# Altium integrated library Axiom_Gamma_LSB.IntLib: 24 symbols
Pins are listed as number, name and electrical type; pins without a type are passive.

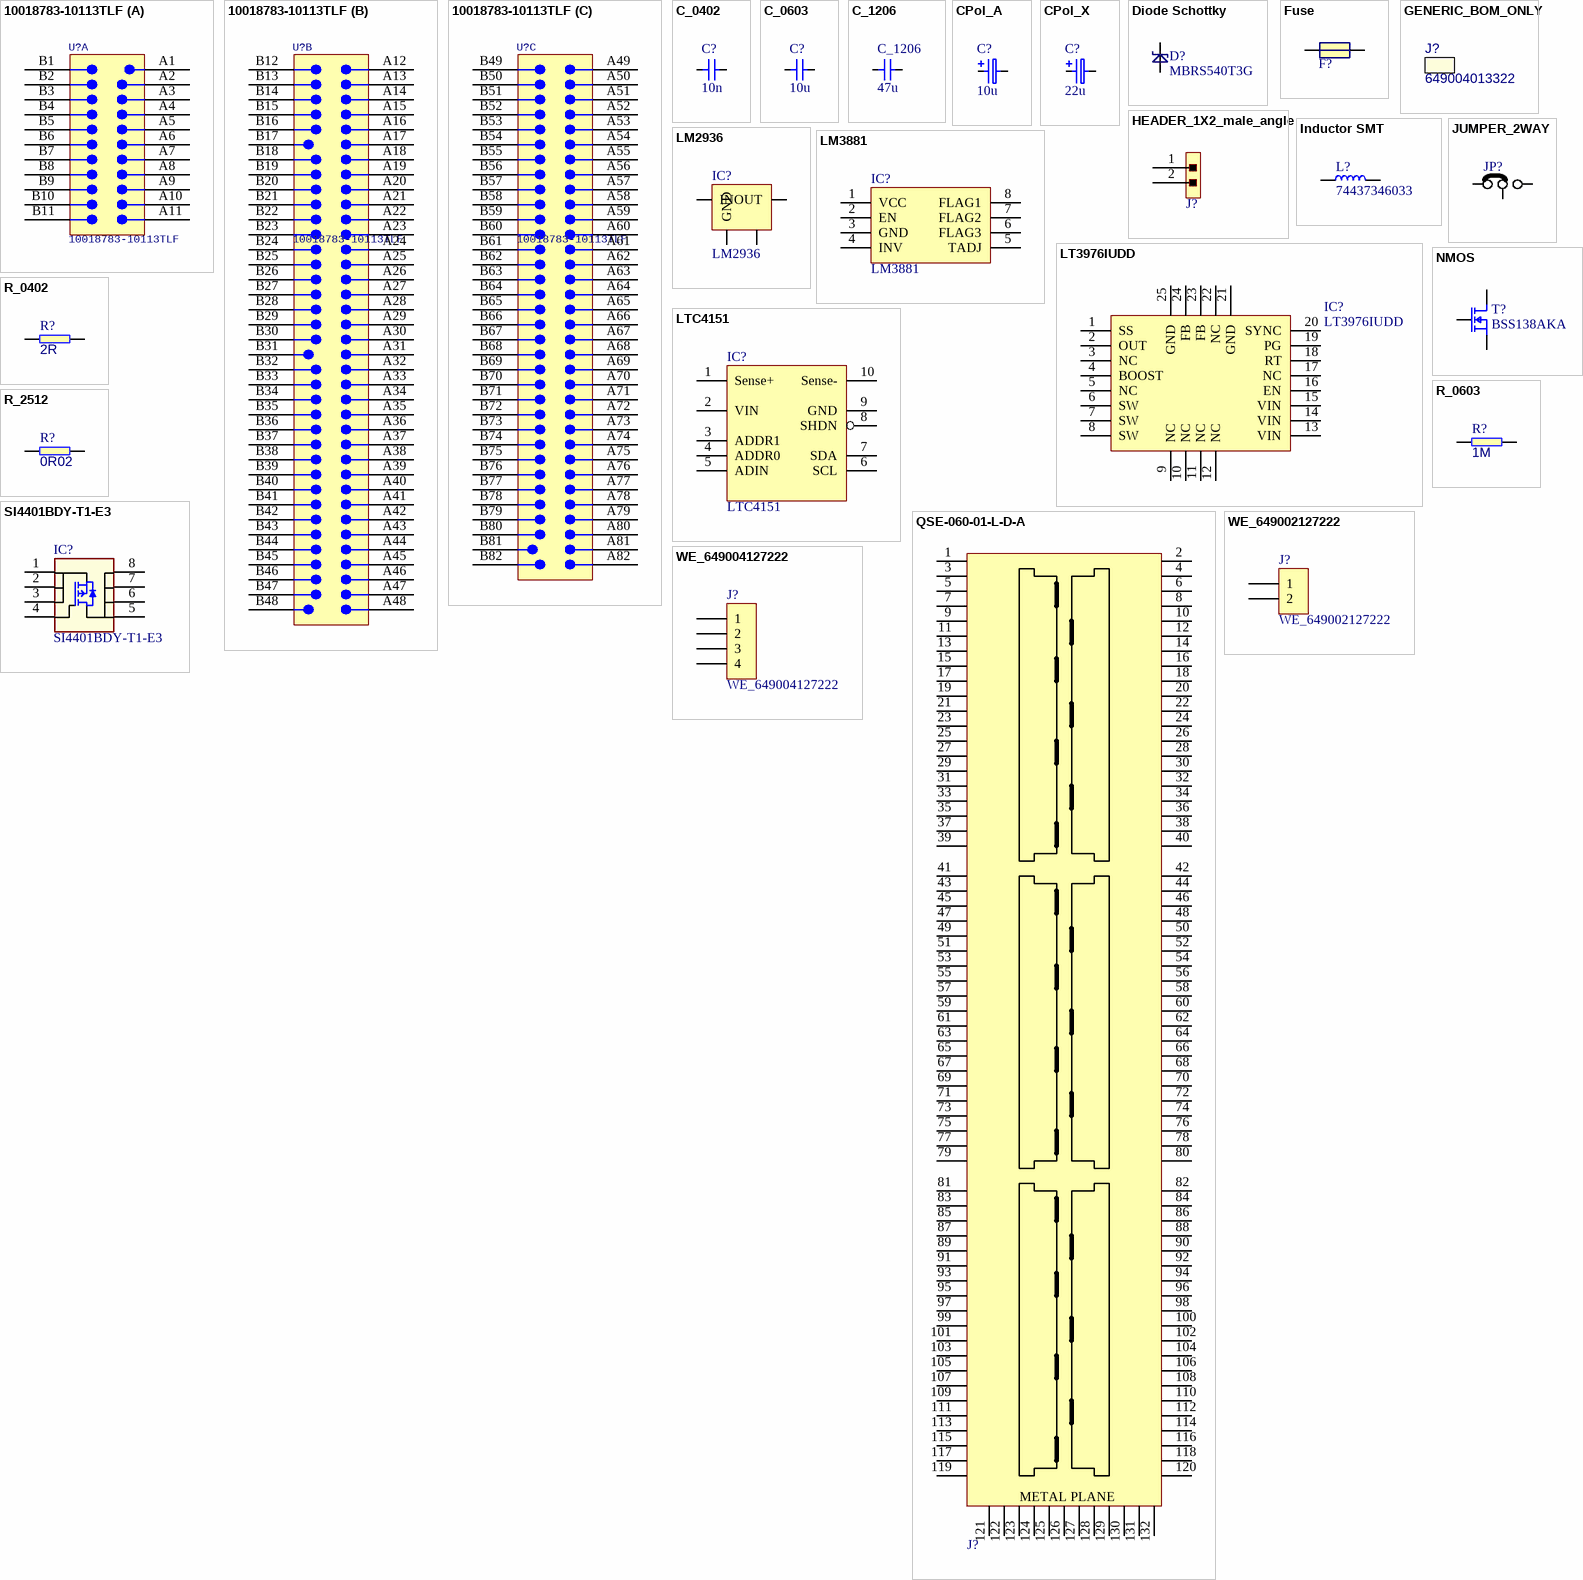
[diagram p0: symbols 10018783-10113TLF to WE_649004127222]

## 10018783-10113TLF
designator U?
PCI Express x16 164 2.36 mm; Part Symbol: 10018783-10113TLF
footprint 10018783-10113TLF
part A pins: A1, A2, A3, A4, A5, A6, A7, A8, A9, A10, A11, B1, B2, B3, B4, B5, B6, B7, B8, B9, B10, B11
part B pins: A12, A13, A14, A15, A16, A17, A18, A19, A20, A21, A22, A23, A24, A25, A26, A27, A28, A29, A30, A31, A32, A33, A34, A35, A36, A37, A38, A39, A40, A41, A42, A43, A44, A45, A46, A47, A48, B12, B13, B14, B15, B16, B17, B18, B19, B20, B21, B22, B23, B24, B25, B26, B27, B28, B29, B30, B31, B32, B33, B34, B35, B36, B37, B38, B39, B40, B41, B42, B43, B44, B45, B46, B47, B48
part C pins: A49, A50, A51, A52, A53, A54, A55, A56, A57, A58, A59, A60, A61, A62, A63, A64, A65, A66, A67, A68, A69, A70, A71, A72, A73, A74, A75, A76, A77, A78, A79, A80, A81, A82, B49, B50, B51, B52, B53, B54, B55, B56, B57, B58, B59, B60, B61, B62, B63, B64, B65, B66, B67, B68, B69, B70, B71, B72, B73, B74, B75, B76, B77, B78, B79, B80, B81, B82

## C_0402
designator C?, comment 10n
MLCC SMT Capacitor 0402; Part Number: C_10n_0402; Manufacturer: AVX; Part Symbol: 04025G103ZAT2A; Value: 10n
footprint 0402
pins: 1, 2
1 alternate drawing of the same symbol

## C_0603
designator C?, comment 10u
MLCC SMT Capacitor  0603; Part Number: C_10u_0603; Manufacturer: MULTICOMP; Part Symbol: MC0603X106M6R3CT; Value: 10u
footprint 0603
pins: 1, 2
1 alternate drawing of the same symbol

## C_1206
designator C_1206, comment 47u
MLCC SMT Capacitor 1206; Part Number: C_47u_1206; Manufacturer: MURATA; Part Symbol: GRM31CC80J476KE18L; Value: 47u
footprint 1206
pins: 1, 2
1 alternate drawing of the same symbol

## CPol_A
designator C?, comment 10u
Tantalum SMT Capacitor Case KEMET_A; Part Number: C_10u_KEMET_A; Manufacturer: VISHAY; Part Symbol: 293D106X9016A2TE3; Value: 10u
footprint KEMET_A
pins: 1, 2
1 alternate drawing of the same symbol

## CPol_X
designator C?  value 22u
Tantalum SMT Capacitor Case KEMET_X; Part Number: C_22u_KEMET_X; Manufacturer: KEMET; Part Symbol: T491X226K050AT
footprint KEMET_X
pins: 1, 2
1 alternate drawing of the same symbol

## Diode Schottky
designator D?, comment MBRS540T3G
ON SEMICONDUCTOR  MBRS540T3G  Rectifier Diode, Single, 40 V, 5 A, 500 mV, 190 A, 150 °C; Part Number: MBRS540T3G; Value: MBRS540T3G; Manufacturer: ON SEMICONDUCTOR; Part Symbol: MBRS540T3G
footprint SMC-403-03
pins: A, C

## Fuse
designator F?, comment MC12CF  (value not drawn)
MULTICOMP  MC12CF 005  Fuse, Surface Mount, 12CF Series, 5 A, 32 VAC, 63 VDC, Very Fast Acting, 1206; Part Number: MC12CF; Value: MC12CF; Manufacturer: MULTICOMP; Part Symbol: MC12CF
footprint 1206
pins: 1, 2

## GENERIC_BOM_ONLY
designator J?, comment 649004013322  (mechanical)
Part Number: GENERIC_BOM_ONLY; Manufacturer: Wuerth Elektronik; Value: 649004013322; Part Symbol: 649004013322

## HEADER_1X2_male_angle
designator J?  (value not drawn)
1x2 pinhead male angle; Part Number: HEADER_1X2_male_angle
footprint HEADER_1X2_male 2.54mm Angle
pins: 1, 2

## Inductor SMT
designator L?, comment 74437346033
3.3 uH, 5.0A, 0.03 ohm, SMD Power Inductor; Part Number: Wurth-74437346033; Manufacturer: WURTH ELEKTRONIK; Value: 74437346033; Part Symbol: 74437346033
footprint WE-LHMI
pins: 1, 2

## JUMPER_2WAY
designator JP?  (no BOM)
Solder jumper; Part Number: Jumper 2 way
footprint JUMPER_2WAY
pins: 1, 2, 3

## LM2936
designator IC?
TEXAS INSTRUMENTS  LM2936MP-3.3/NOPB  Fixed LDO Voltage Regulator, 5.5V to 40V, 200mV Dropout, 3.3Vout, 50mAout, SOT-223-3; Value: LM2936; Part Number: LM2936; Manufacturer: TEXAS INSTRUMENTS; Part Symbol: LM2936MP-3.3/NOPB
footprint SOT223
pins: 1 IN (power), 2 GND (power), 3 OUT, 4 GND

## LM3881
designator IC?
TEXAS INSTRUMENTS  LM3881MME/NOPB  Power Sequencer, 3-Monitors, 2.7V-5.5Vin,VSSOP-8; Part Number: LM3881; Value: LM3881; Manufacturer: TEXAS INSTRUMENTS; Part Symbol: LM3881MME
footprint MSOP-8
pins: 1 VCC, 2 EN (power), 3 GND (power), 4 INV, 5 TADJ (power), 6 FLAG3, 7 FLAG2, 8 FLAG1

## LT3976IUDD
designator IC?
LINEAR TECHNOLOGY  LT3976IUDD#PBF  DC-DC Switching Buck (Step Down) Regulator, Adjustable, 4.3V-40Vin, 1.2V-39.2Vout, 5Aout, QFN-24; Part Number: LT3976IUDD; Value: LT3976IUDD; Manufacturer: LINEAR TECHNOLOGY; Part Symbol: LT3976IUDD#PBF
footprint QFN-24_3x5mm
pins: 1 SS, 2 OUT, 3 NC, 4 BOOST, 5 NC, 6 SW, 7 SW, 8 SW, 9 NC, 10 NC, 11 NC, 12 NC, 13 VIN, 14 VIN, 15 VIN, 16 EN, 17 NC, 18 RT, 19 PG, 20 SYNC, 21 GND, 22 NC, 23 FB, 24 FB, 25 GND

## LTC4151
designator IC?
LINEAR TECHNOLOGY  LTC4151IMS-1#PBF  High Voltage I2C Current and Voltage Monitor, 7V-80Vin, MSOP-10; Part Number: LTC4151; Value: LTC4151; Manufacturer: LINEAR TECHNOLOGY; Part Symbol: LTC4151IMS-1#PBF
footprint MSOP10
pins: 1 Sense+, 2 VIN, 3 ADDR1, 4 ADDR0, 5 ADIN, 6 SCL, 7 SDA, 8 SHDN, 9 GND, 10 Sense-

## NMOS
designator T?, comment BSS138AKA
MOSFET, N CH, 60V, 0.2A; Part Number: BSS138; Manufacturer: NXP; Value: BSS138AKA; Part Symbol: BSS138AKA
footprint SOT-23 (SOT23, 3-Leads, Body 2.90x2.45mm, Pitch 0.95mm, IPC Medium Density)
pins: 1 G, 2 S, 3 D

## QSE-060-01-L-D-A
designator J?  (value not drawn)
SAMTEC 	QSE-60-01-L-D-A  Stacking Board Connector, Dual Row, QSE Series, Receptacle, 0.8 m, 120 Contacts, Surface Mount; Part Number: QSE-060-01-L-D-A; Value: QSE-060-01-L-D-A; Manufacturer: SAMTEC; Part Symbol: QSE-060-01-L-D-A
footprint QSE-060-01-L-D-A
pins: 1, 2, 3, 4, 5, 6, 7, 8, 9, 10, 11, 12, 13, 14, 15, 16, 17, 18, 19, 20, 21, 22, 23, 24, 25, 26, 27, 28, 29, 30, 31, 32, 33, 34, 35, 36, 37, 38, 39, 40, 41, 42, 43, 44, 45, 46, 47, 48, 49, 50, 51, 52, 53, 54, 55, 56, 57, 58, 59, 60, 61, 62, 63, 64, 65, 66, 67, 68, 69, 70, 71, 72, 73, 74, 75, 76, 77, 78, 79, 80, 81, 82, 83, 84, 85, 86, 87, 88, 89, 90, 91, 92, 93, 94, 95, 96, 97, 98, 99, 100, 101, 102, 103, 104, 105, 106, 107, 108, 109, 110, 111, 112, 113, 114, 115, 116, 117, 118, 119, 120, 121, 122, 123, 124, 125, 126, 127, 128, 129, 130, 131, 132
text: METAL PLANE

## R_0402
designator R?, comment 2R
SMT Resistor 0402; Part Number: R_2R_0402; Manufacturer: MULTICOMP; Part Symbol: MC00625W040212R0; Value: 2R
footprint 0402
pins: 1, 2

## R_0603
designator R?, comment 1M
SMT Resistor 0603; Part Number: R_1M_0603_0.1%; Manufacturer: TE; Part Symbol: CPF0603B1M0E; Value: 1M
footprint 0603
pins: 1, 2

## R_2512
designator R?, comment 0R02
SMT Resistor 2512; Part Number: R_0R02_2512; Manufacturer: BOURNS; Part Symbol: CRA2512-FZ-R020ELF / CRA2512-FZ-R020ELF / CRA2512-FZ-R020ELF; Value: 0R02
footprint 2512
pins: 1, 2

## SI4401BDY-T1-E3
designator IC?
VISHAY  SI4401BDY-T1-E3  MOSFET Transistor, P Channel, -8.7 A, -40 V, 0.011 ohm, -10 V, -3 V; Part Number: SI4401BDY-T1-E3; Value: SI4401BDY-T1-E3; Manufacturer: VISHAY; Part Symbol: SI4401BDY-T1-E3
footprint SOIC-SN8_M
pins: 1, 2, 3, 4, 5, 6, 7, 8

## WE_649002127222
designator J?
4.20mm Male Single Row Angled Header w. Mounting Pegs WR-MPC4; Manufacturer: WURTH ELEKTRONIC; Part Number: WE_649002127222; Value: WE_649002127222; Part Symbol: 649002127222
footprint WE_649002127222
pins: 1, 2

## WE_649004127222
designator J?
4.20mm Male Single Row Angled Header w. Mounting Pegs WR-MPC4; Manufacturer: WURTH ELEKTRONIC; Part Number: WE_649004127222; Value: WE_649004127222; Part Symbol: 649004127222
footprint WE_649004127222
pins: 1, 2, 3, 4